# Altium schematic symbol library LATTICEPLDS_Library.SchLib: 291 symbols (part 32 of 32)
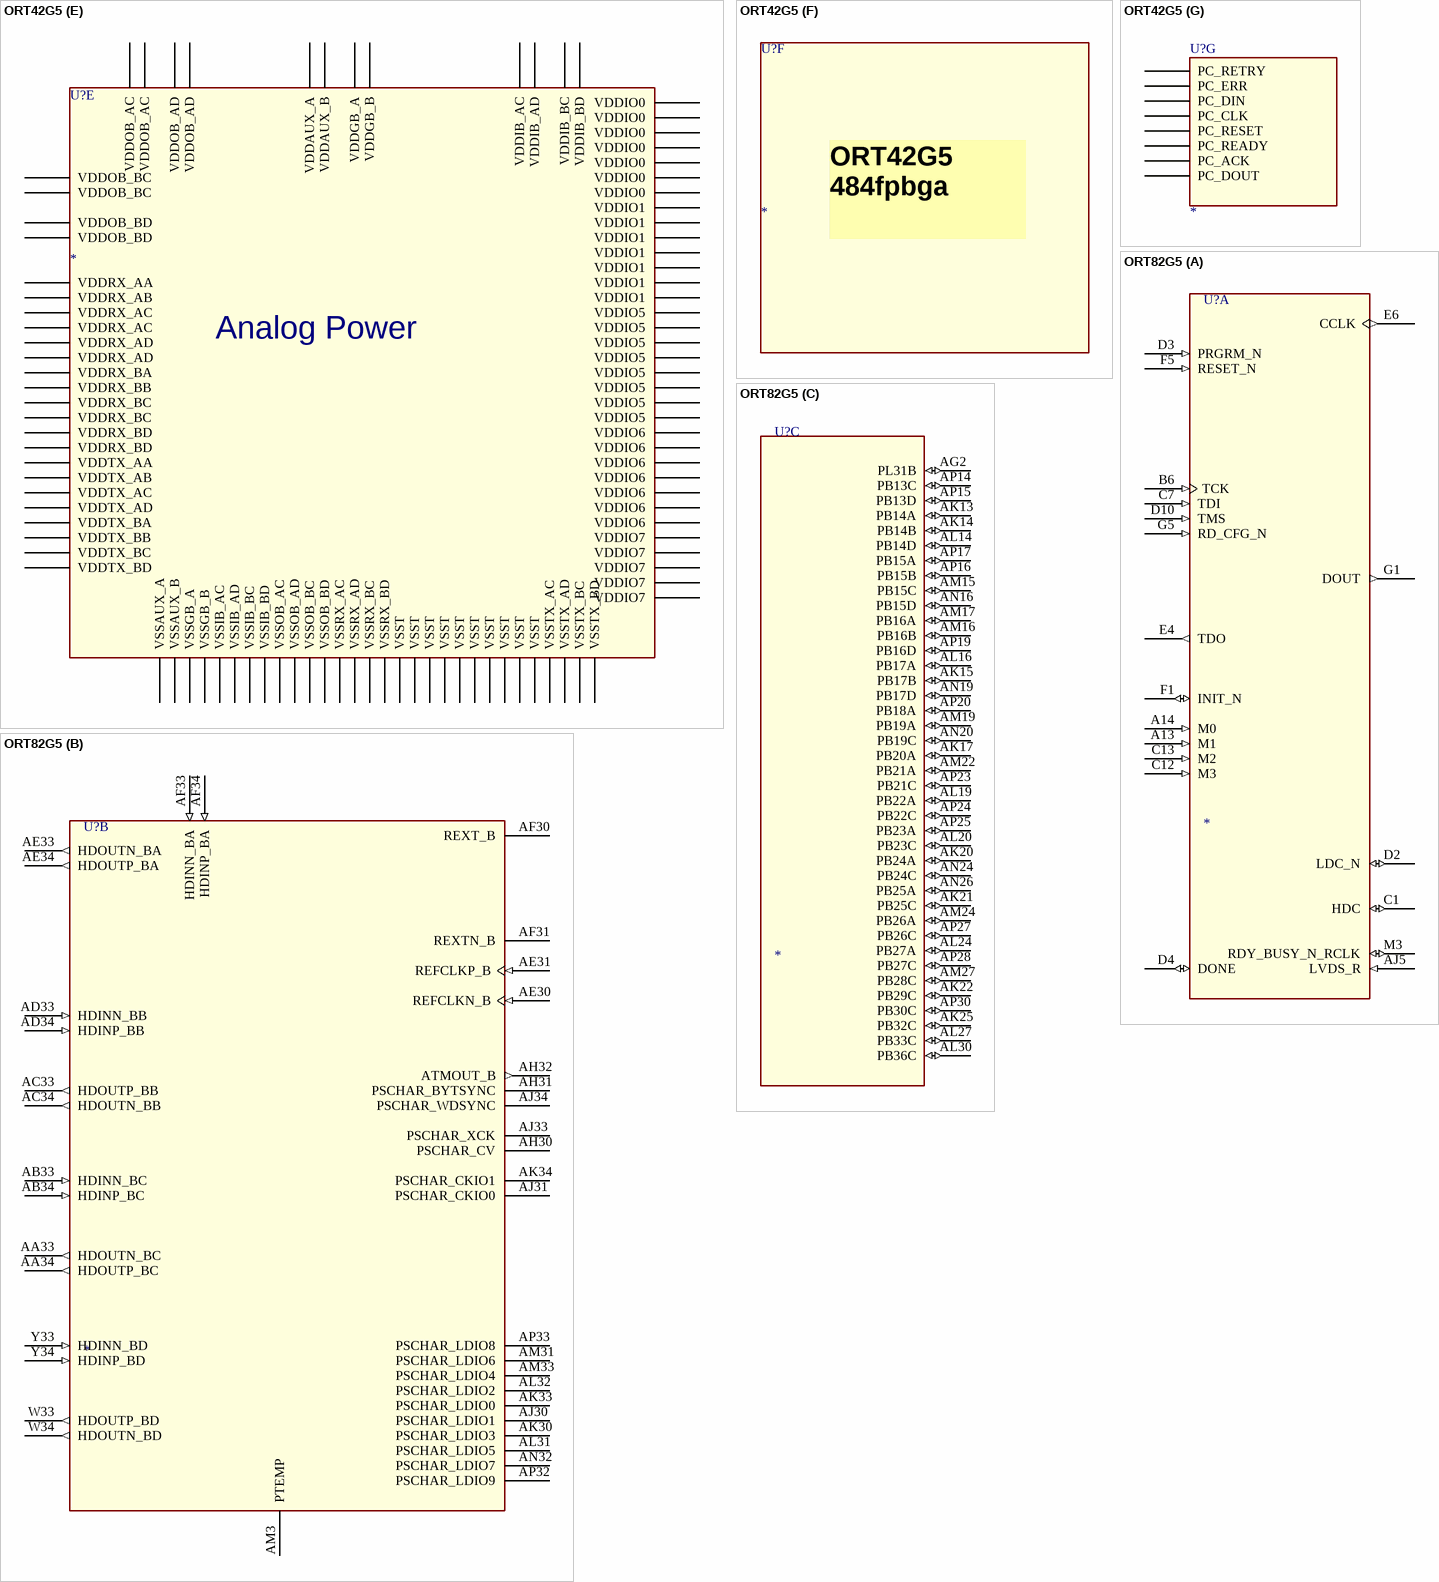
[diagram p334: symbols ORT42G5 to ORT82G5]

## ORT42G5
designator U?
footprint 484pbga
part A pins: A3 CFG_IRQ_N/MPI_IRQ_N, A4 TDI, A5 A18/MPI_TSZ0, A6 D0, A8 A21/MPI_BURST_N, A9 MPI_ACK_N, A12 PTCK0C, A13 DEBUG_BUS2, A15 DEBUG_BUS6, A16 DEBUG_BUS7, A17 DEBUG_BUS10, A18 DEBUG_BUS12, A19 DEBUG_BUS14, AA2 PLL_CK6T, AA4 D15, AB2 PLL_CK6C, AB3 DP3, B3 CCLK, B4 TCK, B5 D3, B6 TMS, B8 MPI_CLK, B9 MPI_RTRY_N, B10 DEBUG_BUS0, B11 DEBUG_BUS1, B12 PTCK0T, B15 DEBUG_BUS5, B18 DEBUG_BUS11, B19 DEBUG_BUS15, C1 PLL_CK0T, C2 PLL_CK0C, C3 DONE, C4 PLL_CK1C, C5 D1, C6 A20/MPI_BDIP_N, C7 M2, C8 M1, C10 PTCK1T, C11 DEBUG_BUS3, C12 DEBUG_BUS8, C13 DEBUG_BUS13, D1 D6, D2 D5, D3 RESET_N, D4 PLL_CK1T, D5 D2, D6 A19/MPI_TSZ1, D7 M3, D8 M0, D10 PTCK1C, D11 DEBUG_BUS4, D12 DEBUG_BUS9, E1 LDC_N, E2 HDC, E4 RD_DATA/TDO, E6 MPI_TEA_N, F1 A17, F4 PRGRM_N, F5 RD_CFG_N, G1 CS1, G2 CS0_N, G4 D7, H1 INIT_N, H2 DOUT, H3 A16, J1 A15, J2 A14, J3 RDY/BUSY_N/RCLK, J4 D4, K1 A13, K2 A12, K4 A11, K5 RD_N/MPI_STRB_N, L1 PLCK0C, L2 PLCK0T/SCKA, L3 A10, L4 A9, L5 A8, M1 A5, M2 A6, M3 PLCK1C, M4 PLCK1T/SCKB, N1 A2, N2 A3, N3 WR_N, N4 A7, N5 A4, P1 A0, P2 A1, P3 DP0, P4 DP1, R1 D10, R2 D9, R4 D8, U1 D11, U2 D12, U3 PTEMP, V2 D13, V4 LVDS_R, W3 DP2, W4 D14, W10 PBCK0T, W12 PBCK1C, Y1 PLL_CK7C, Y2 PLL_CK7T, Y10 PBCK0C, Y12 PBCK1T
part B pins: A7 PT9C, A10 PT14C/VREF_1_06, A11 PT16D/VREF_1_05, A14 PT20D, A20 PT29C, A21 PT31C/VREF_1_09, AA3 PB4A/VREF_6_05, AA5 PB8C/VREF_6_07, AA6 PB11C, AA7 PB14C/VREF_6_10, AA8 PB16C/VREF_6_11, AA9 PB18C/VREF_5_01, AA10 PB19B, AA11 PB20D, AA12 PB22D, AA13 PB24D, AA14 PB25D/VREF_5_04, AA15 PB27D, AA16 PB28D/VREF_5_06, AA17 PB30D, AA18 PB33D/VREF_5_08, AB4 PB6D, AB5 PB8D, AB6 PB11D, AB7 PB14D, AB8 PB16D, AB9 PB18D, AB10 PB19A, AB11 PB20C/VREF_5_02, AB12 PB22C, AB13 PB24C, AB14 PB25C, AB15 PB27C, AB16 PB28C, AB17 PB30C, AB18 PB33C, B7 PT9D/VREF_0_03, B13 PT19C/VREF_1_04, B14 PT20C, B16 PT24C/VREF_1_03, B17 PT26C/VREF_1_02, B20 PT29D, B21 PT31D, C9 PT15C, C14 PT30C, C15 PT33C/VREF_1_08, C16 PT36B, C18 PT32D, C19 PT32C, D9 PT15D, D13 PT27D/VREF_1_01, D14 PT30D, D15 PT33D, D16 PT36D, E11 PT22D, E14 PT34D/VREF_1_07, E15 PT34B, F14 PT35D, F15 PT35B, U8 PB16A, U9 PB18A, U10 PB21A, U11 PB22A, U12 PB23A, V6 PB9C, V7 PB14A, V8 PB15A, V9 PB17A, V10 PB20A, V11 PB24A, V12 PB25A, V14 PB34D, V16 PB35B, W5 PB7C, W6 PB10C/VREF_6_08, W7 PB12C/VREF_6_09, W8 PB15C, W9 PB17C, W11 PB21D/VREF_5_03, W13 PB26D/VREF_5_05, W14 PB29D, W15 PB31D, W16 PB36D, Y4 PB5C/VREF_6_06, Y5 PB7D, Y6 PB10D, Y7 PB12D, Y8 PB15D, Y9 PB17D, Y11 PB21C, Y13 PB26C, Y14 PB29C, Y15 PB31C/VREF_5_07, Y16 PB36C
part C pins: C21 PASB_RESETN, C22 PASB_TRISTN, D18 PLOOP_TEST_ENN, D19 PBIST_TEST_ENN, D21 PSYS_RSSIG_ALL, D22 PSYS_DOBISTN, E16 PASB_TESTCLK, E17 PASB_PDN, F21 REXTN_A, F22 REXT_A, G21 REFCLKP_A, G22 REFCLKN_A, H21 HDINP_AC, H22 HDINN_AC, J21 HDOUTP_AC, J22 HDOUTN_AC, K21 HDINN_AD, K22 HDINP_AD, L21 HDOUTN_AD, L22 HDOUTP_AD, M21 HDOUTP_BD, M22 HDOUTN_BD, N21 HDINP_BD, N22 HDINN_BD, R21 HDOUTN_BC, R22 HDOUTP_BC, T21 HDINN_BC, T22 HDINP_BC, U21 REFCLKN_B, U22 REFCLKP_B, V21 REXT_B, V22 REXTN_B
part D pins: A1 VSS (power), A2 VSS (power), A22 VSS (power), AA1 VSS (power), AA19 VSS (power), AA20 VSS (power), AA21 VSS (power), AA22 VSS (power), AB1 VSS (power), AB19 VSS (power), AB20 VSS (power), AB21 VSS (power), AB22 VSS (power), B1 VSS (power), B2 VSS (power), B22 VSS (power), C17 VDD33 (power), C20 VDD15 (power), D17 VDD33 (power), D20 VDD33 (power), E3 VDD33 (power), E5 VDD15 (power), F6 VDD15 (power), F7 VDD15 (power), F8 VDD15 (power), F9 VDD15 (power), F10 VDD15 (power), F11 VDD15 (power), F12 VDD15 (power), F13 VDD15 (power), F17 VDD15 (power), G6 VDD15 (power), G7 VSS (power), G8 VSS (power), G9 VSS (power), G10 VSS (power), G11 VSS (power), G12 VSS (power), G13 VSS (power), G16 VDD15 (power), H6 VDD15 (power), H7 VSS (power), H8 VSS (power), H9 VSS (power), H10 VSS (power), H11 VSS (power), H12 VSS (power), H13 VSS (power), H14 VDD15 (power), H15 VDD15 (power), J6 VDD15 (power), J7 VSS (power), J8 VSS (power), J9 VSS (power), J10 VSS (power), J11 VSS (power), J12 VSS (power), J13 VSS (power), J14 VSS (power), J15 VDD15 (power), K7 VDD15 (power), K8 VSS (power), K9 VSS (power), K10 VSS (power), K11 VSS (power), K12 VSS (power), K13 VSS (power), K14 VSS (power), K15 VDD15 (power), L7 VDD15 (power), L8 VSS (power), L9 VSS (power), L10 VSS (power), L11 VSS (power), L12 VSS (power), L13 VSS (power), L14 VSS (power), L15 VDD15 (power), M7 VDD15 (power), M8 VSS (power), M9 VSS (power), M10 VSS (power), M11 VSS (power), M12 VSS (power), M13 VSS (power), M14 VSS (power), M15 VDD15 (power), N7 VDD15 (power), N8 VSS (power), N9 VSS (power), N10 VSS (power), N11 VSS (power), N12 VSS (power), N13 VSS (power), N14 VSS (power), N15 VDD15 (power), P6 VDD15 (power), P7 VSS (power), P8 VSS (power), P9 VSS (power), P10 VSS (power), P11 VSS (power), P12 VSS (power), P13 VSS (power), P14 VSS (power), P15 VDD15 (power), R6 VDD15 (power), R7 VSS (power), R8 VSS (power), R9 VSS (power), R10 VSS (power), R11 VSS (power), R12 VSS (power), R13 VSS (power), R14 VSS (power), R15 VDD15 (power), T4 VDD15 (power), T6 VDD15 (power), T7 VDD15 (power), T10 VDD15 (power), T11 VDD15 (power), T12 VDD15 (power), T13 VDD15 (power), T14 VDD15 (power), T15 VDD15 (power), T16 VDD15 (power), U4 VDD15 (power), U5 VDD15 (power), U17 VDD15 (power), V3 VDD33 (power), V5 VDD15 (power), V15 VDD33 (power), V18 VDD15 (power), W19 VDD15 (power), Y3 VDD15 (power), Y17 VDD33 (power), Y18 VDD33 (power), Y19 VDD15 (power), Y20 VDD15 (power)
part E pins: E7 VDDIO0 (power), E8 VDDIO0 (power), E9 VDDIO0 (power), E10 VDDIO0 (power), E12 VDDIO1 (power), E13 VDDIO1 (power), E18 VDDIO1 (power), E19 VDDIO1 (power), E20 VSSAUX_B (power), E21 VDDGB_A (power), E22 VSSGB_A (power), F16 VDDIO1 (power), F18 VDDAUX_B (power), F19 VSSIB_BC (power), F20 VSSRX_BC (power), G5 VDDIO0 (power), G14 VDDIO1 (power), G15 VDDIO1 (power), G17 VDDRX_BA (power), G18 VDDTX_BA (power), G19 VSSOB_BC (power), G20 VDDIB_AC (power), H5 VDDIO0 (power), H16 VSSTX_BC (power), H17 VSSIB_BD (power), H18 VSSRX_BD (power), H19 VSSOB_BD (power), H20 VDDOB_AC (power), J5 VDDIO0 (power), J16 VDDRX_BB (power), J17 VDDTX_BB (power), J18 VDDRX_BC (power), J19 VDDRX_BC (power), J20 VDDOB_AC (power), K6 VDDIO7 (power), K16 VDDTX_BC (power), K17 VDDRX_BD (power), K18 VDDRX_BD (power), K19 VDDTX_BD (power), K20 VDDIB_AD (power), L6 VDDIO7 (power), L16 VSSTX_BD (power), L17 VSSTX_AD (power), L18 VSSOB_AD (power), L19 VSSRX_AD (power), L20 VDDOB_AD (power), M5 VDDIO7 (power), M6 VDDIO7 (power), M16 VSSIB_AD (power), M17 VSSTX_AC (power), M18 VSSOB_AC (power), M19 VSSRX_AC (power), M20 VDDOB_AD (power), N6 VDDIO7 (power), N16 VDDTX_AD (power), N17 VDDRX_AD (power), N18 VDDRX_AD (power), N19 VDDTX_AC (power), N20 VDDOB_BD (power), P5 VDDIO6 (power), P16 VDDRX_AC (power), P17 VDDRX_AC (power), P18 VDDTX_AB (power), P19 VDDRX_AB (power), P20 VDDOB_BD (power), P21 VDDOB_BC (power), P22 VDDIB_BD (power), R5 VDDIO6 (power), R16 VSSIB_AC (power), R17 VSSAUX_A (power), R18 VSST (power), R19 VSST (power), R20 VDDOB_BC (power), T5 VDDIO6 (power), T8 VDDIO6 (power), T9 VDDIO6 (power), T17 VDDTX_AA (power), T18 VDDRX_AA (power), T19 VSST (power), T20 VDDIB_BC (power), U6 VDDIO6 (power), U7 VDDIO6 (power), U13 VDDIO5 (power), U14 VDDIO5 (power), U15 VDDIO5 (power), U16 VDDIO5 (power), U18 VDDAUX_A (power), U19 VSST (power), U20 VSST (power), V13 VDDIO5 (power), V17 VDDIO5 (power), V19 VSST (power), V20 VSST (power), W17 VDDIO5 (power), W18 VDDIO5 (power), W20 VSST (power), W21 VSSGB_B (power), W22 VDDGB_B (power), Y21 VSST (power), Y22 VSST (power)
part G pins: F3 PC_DIN, G3 PC_CLK, H4 PC_READY, K3 PC_ACK, R3 PC_DOUT, T1 PC_ERR, T2 PC_RETRY, T3 PC_RESET
part A text: CFG/MPI
part B text: General / FPGA / Pins
part C text: SERDES
part D text: Digital Power
part E text: Analog Power
part F text: ORT42G5 / 484fpbga

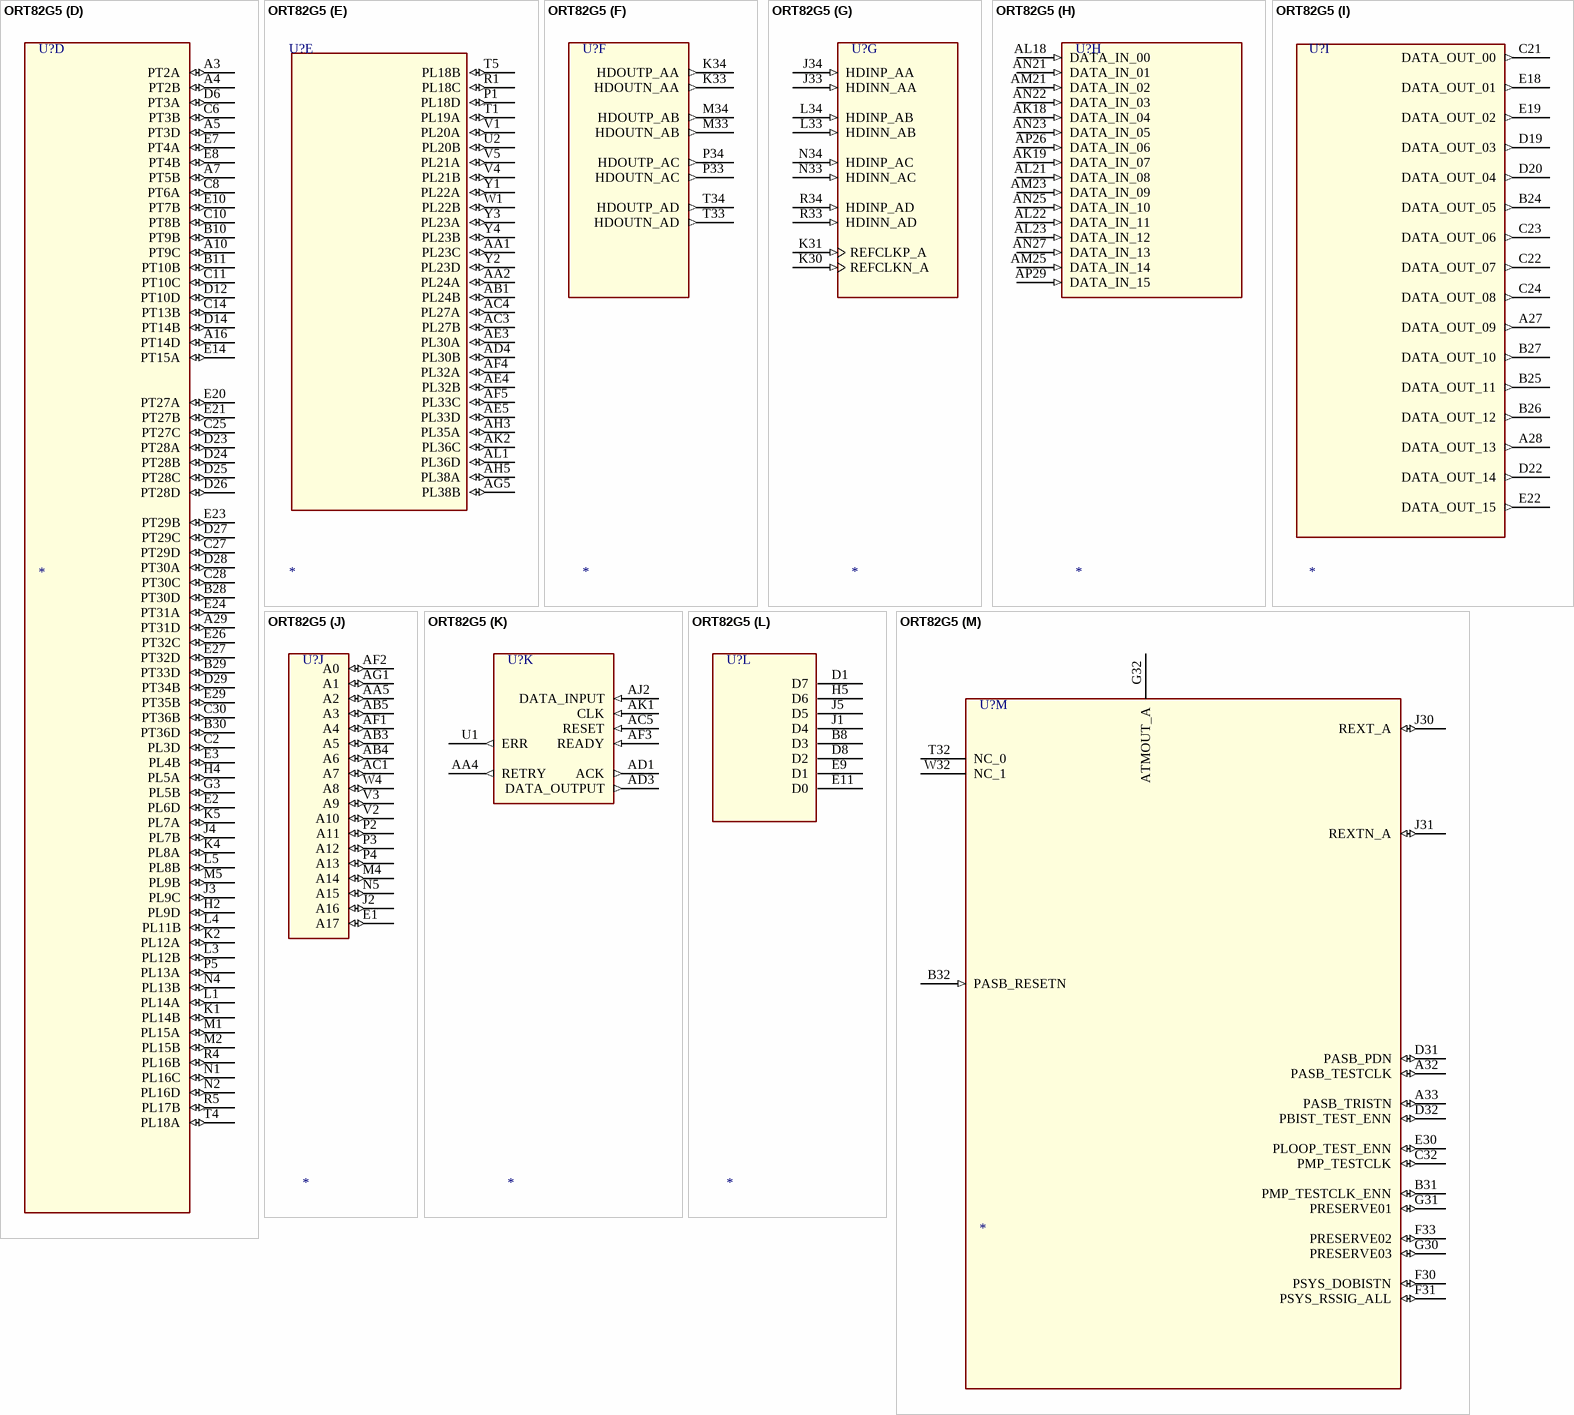
[diagram p297: symbol ORT82G5]

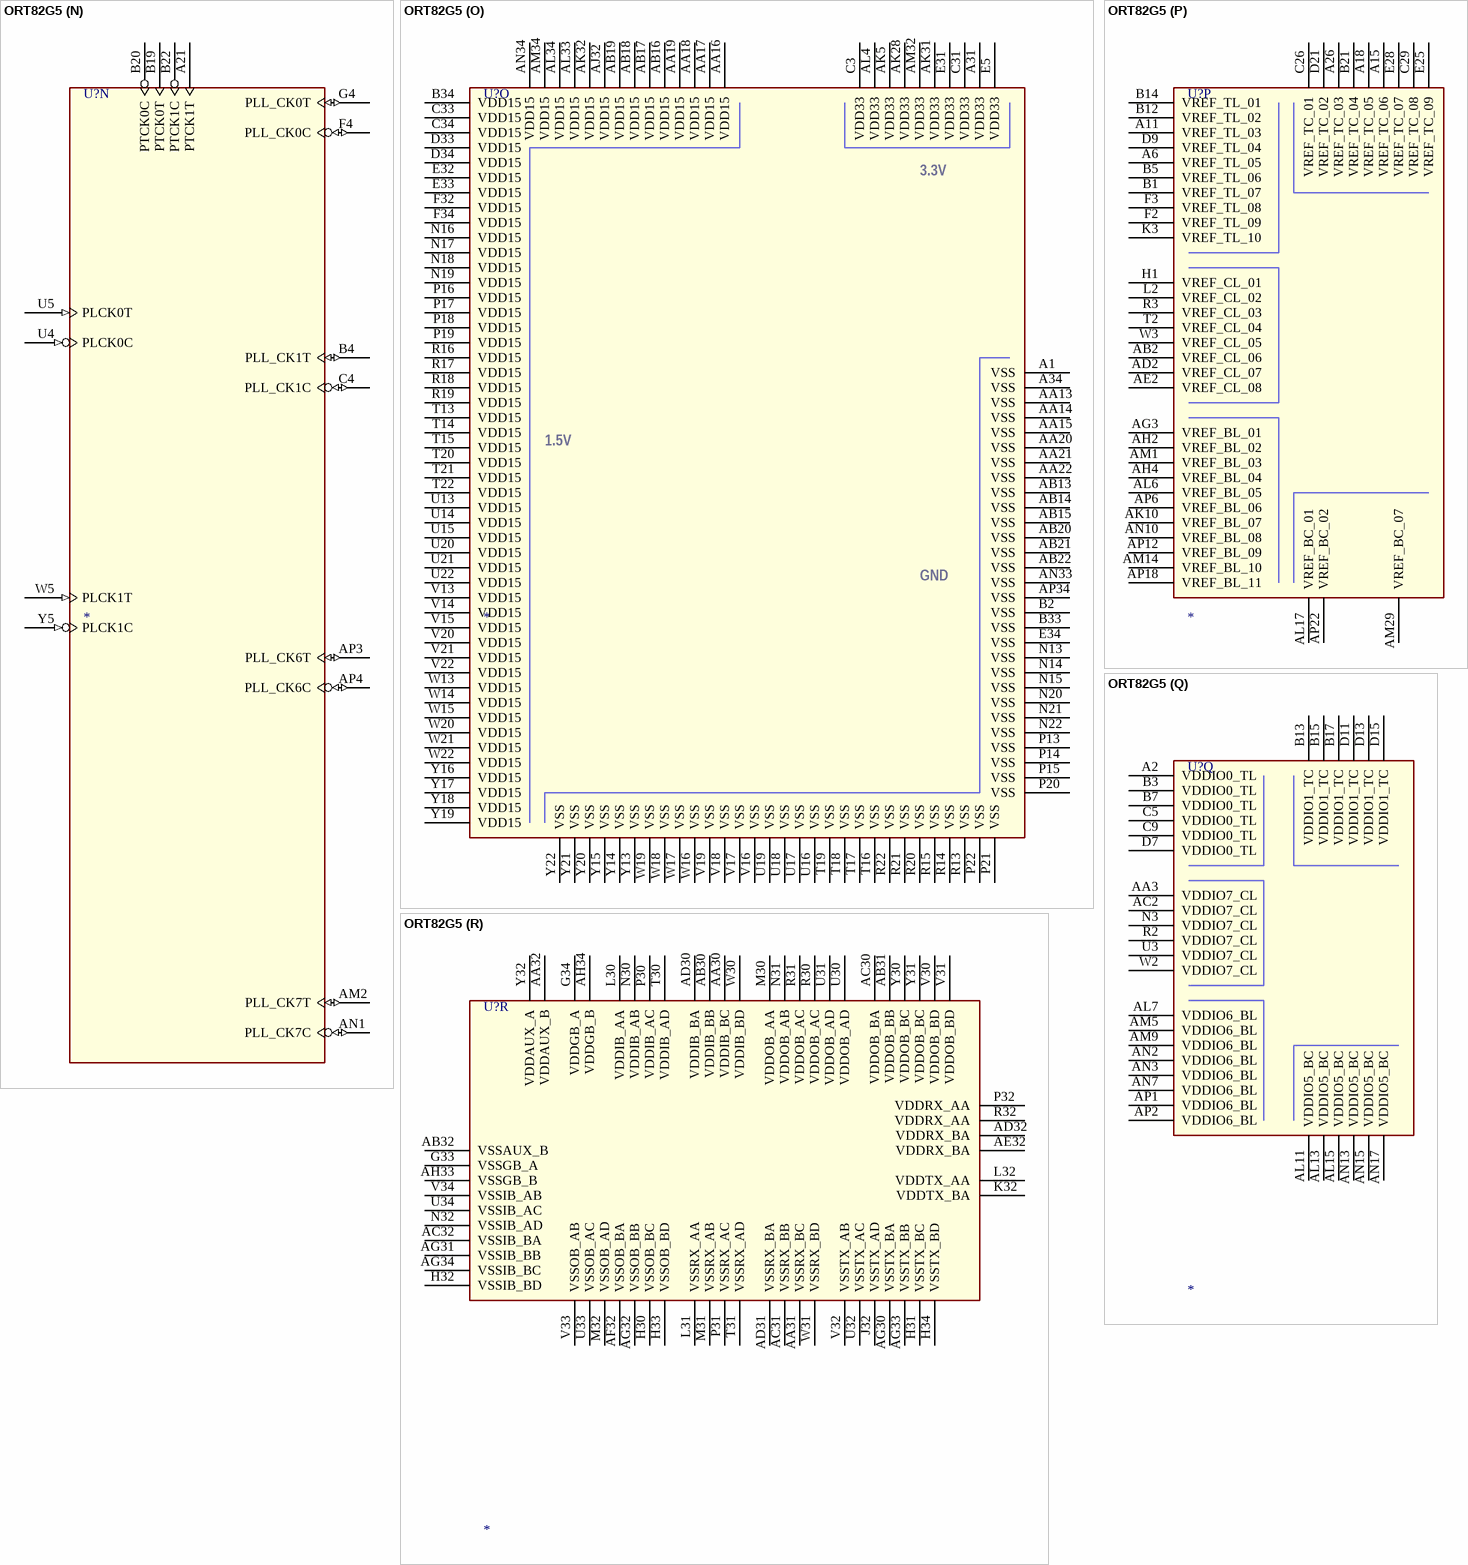
[diagram p298: symbol ORT82G5]

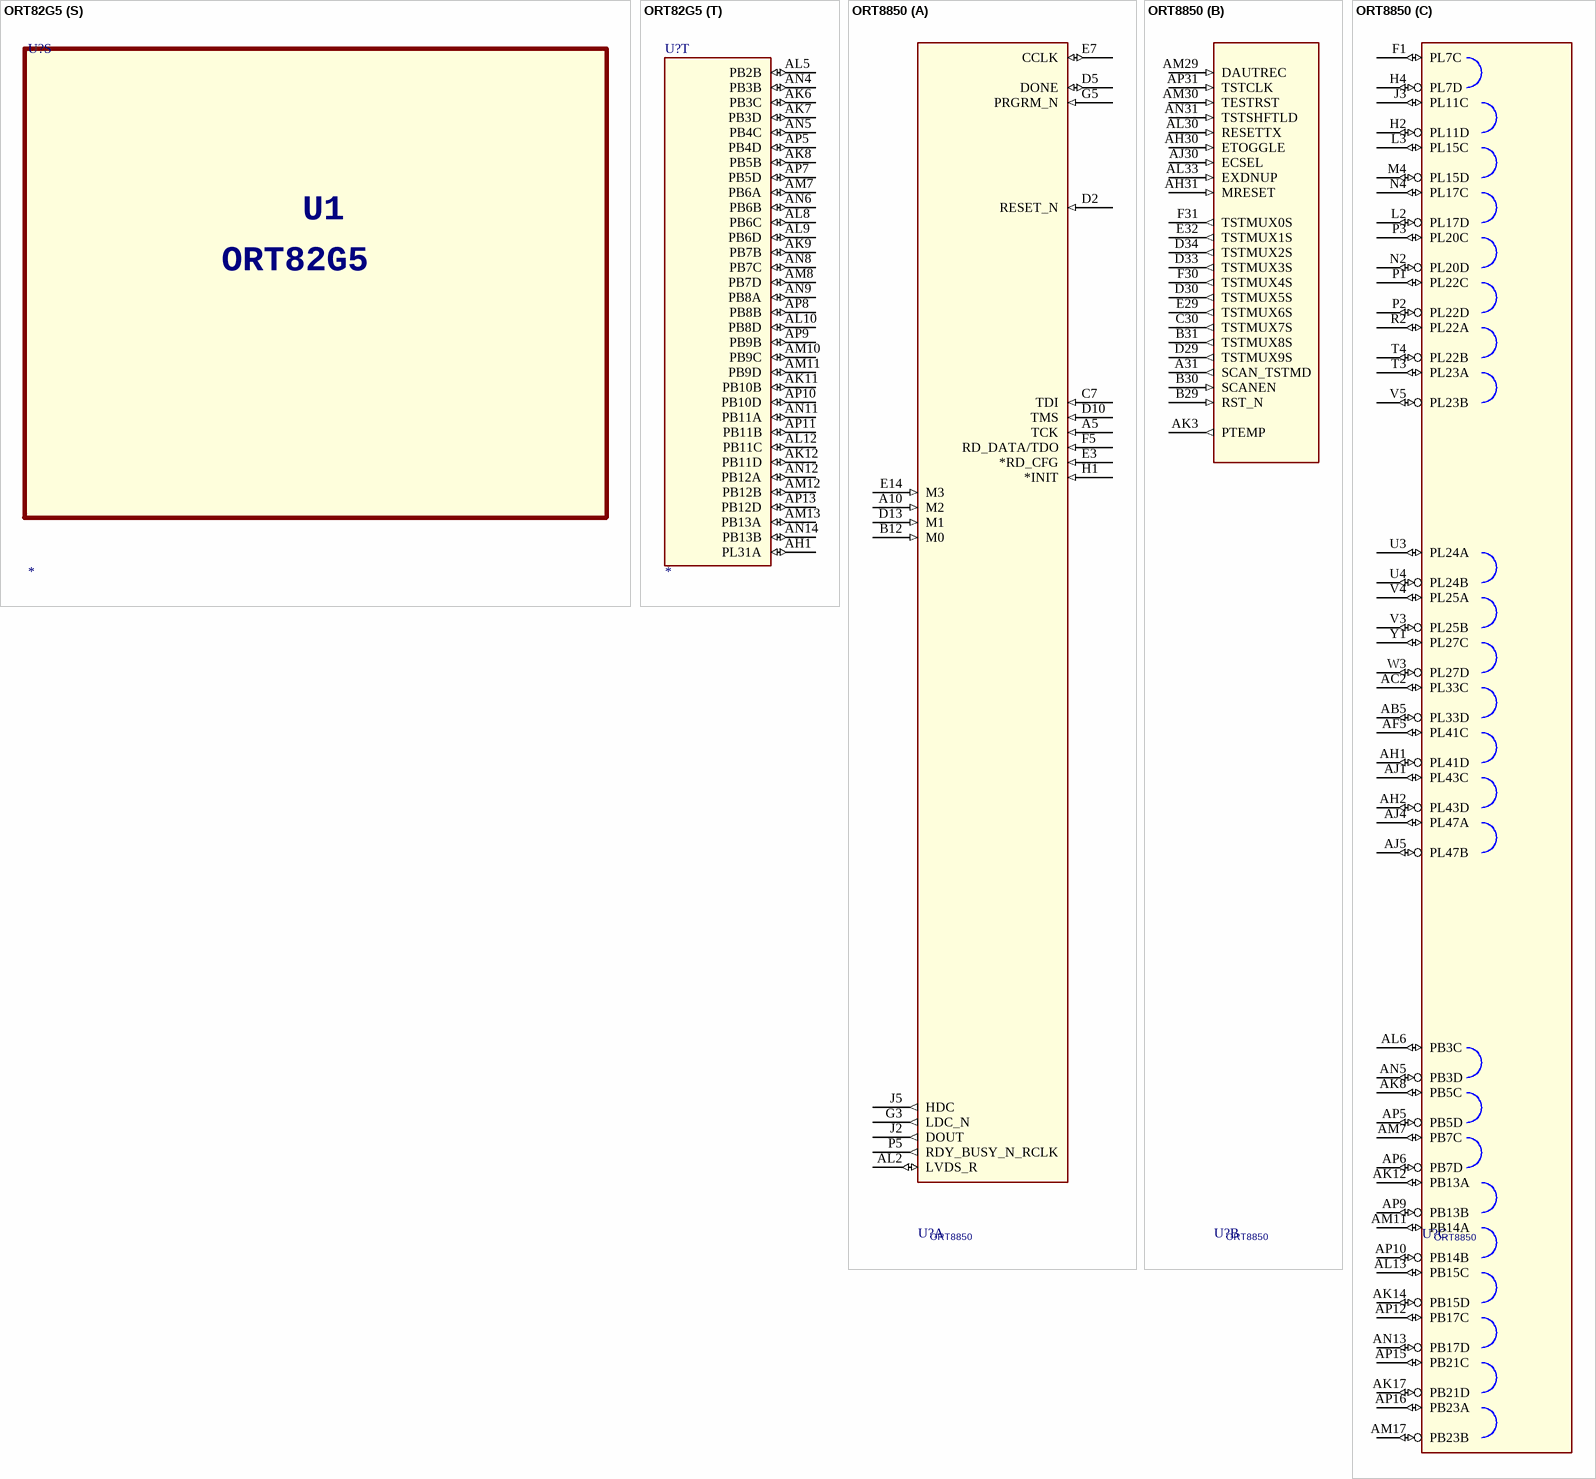
[diagram p299: symbols ORT82G5 to ORT8850]

## ORT82G5
designator U?
footprint 680pinbga
part A pins: A13 M1 (in), A14 M0 (in), AJ5 LVDS_R (in), B6 TCK (in), C1 HDC (io), C7 TDI (in), C12 M3 (in), C13 M2 (in), D2 LDC_N (io), D3 PRGRM_N (in), D4 DONE (io), D10 TMS (in), E4 TDO (out), E6 CCLK (out), F1 INIT_N (io), F5 RESET_N (in), G1 DOUT (out), G5 RD_CFG_N (in), M3 RDY_BUSY_N_RCLK (io)
part B pins: AA33 HDOUTN_BC (out), AA34 HDOUTP_BC (out), AB33 HDINN_BC (in), AB34 HDINP_BC (in), AC33 HDOUTP_BB (out), AC34 HDOUTN_BB (out), AD33 HDINN_BB (in), AD34 HDINP_BB (in), AE30 REFCLKN_B (in), AE31 REFCLKP_B (in), AE33 HDOUTN_BA (out), AE34 HDOUTP_BA (out), AF30 REXT_B, AF31 REXTN_B, AF33 HDINN_BA (in), AF34 HDINP_BA (in), AH30 PSCHAR_CV, AH31 PSCHAR_BYTSYNC, AH32 ATMOUT_B (out), AJ30 PSCHAR_LDIO1, AJ31 PSCHAR_CKIO0, AJ33 PSCHAR_XCK, AJ34 PSCHAR_WDSYNC, AK30 PSCHAR_LDIO3, AK33 PSCHAR_LDIO0, AK34 PSCHAR_CKIO1, AL31 PSCHAR_LDIO5, AL32 PSCHAR_LDIO2, AM3 PTEMP, AM31 PSCHAR_LDIO6, AM33 PSCHAR_LDIO4, AN32 PSCHAR_LDIO7, AP32 PSCHAR_LDIO9, AP33 PSCHAR_LDIO8, W33 HDOUTP_BD (out), W34 HDOUTN_BD (out), Y33 HDINN_BD (in), Y34 HDINP_BD (in)
part C pins: AG2 PL31B (io), AK13 PB14A (io), AK14 PB14B (io), AK15 PB17B (io), AK17 PB20A (io), AK20 PB24A (io), AK21 PB25C (io), AK22 PB29C (io), AK25 PB32C (io), AL14 PB14D (io), AL16 PB17A (io), AL19 PB22A (io), AL20 PB23C (io), AL24 PB27A (io), AL27 PB33C (io), AL30 PB36C (io), AM15 PB15C (io), AM16 PB16B (io), AM17 PB16A (io), AM19 PB19A (io), AM22 PB21A (io), AM24 PB26A (io), AM27 PB28C (io), AN16 PB15D (io), AN19 PB17D (io), AN20 PB19C (io), AN24 PB24C (io), AN26 PB25A (io), AP14 PB13C (io), AP15 PB13D (io), AP16 PB15B (io), AP17 PB15A (io), AP19 PB16D (io), AP20 PB18A (io), AP23 PB21C (io), AP24 PB22C (io), AP25 PB23A (io), AP27 PB26C (io), AP28 PB27C (io), AP30 PB30C (io)
part D pins: A3 PT2A (io), A4 PT2B (io), A5 PT3D (io), A7 PT5B (io), A10 PT9C (io), A16 PT14D (io), A29 PT31D (io), B10 PT9B (io), B11 PT10B (io), B28 PT30D (io), B29 PT33D (io), B30 PT36D (io), C2 PL3D (io), C6 PT3B (io), C8 PT6A (io), C10 PT8B (io), C11 PT10C (io), C14 PT13B (io), C25 PT27C (io), C27 PT29D (io), C28 PT30C (io), C30 PT36B (io), D6 PT3A (io), D12 PT10D (io), D14 PT14B (io), D23 PT28A (io), D24 PT28B (io), D25 PT28C (io), D26 PT28D (io), D27 PT29C (io), D28 PT30A (io), D29 PT34B (io), E2 PL6D (io), E3 PL4B (io), E7 PT4A (io), E8 PT4B (io), E10 PT7B (io), E14 PT15A (io), E20 PT27A (io), E21 PT27B (io), E23 PT29B (io), E24 PT31A (io), E26 PT32C (io), E27 PT32D (io), E29 PT35B (io), G3 PL5B (io), H2 PL9D (io), H4 PL5A (io), J3 PL9C (io), J4 PL7B (io), K1 PL14B (io), K2 PL12A (io), K4 PL8A (io), K5 PL7A (io), L1 PL14A (io), L3 PL12B (io), L4 PL11B (io), L5 PL8B (io), M1 PL15A (io), M2 PL15B (io), M5 PL9B (io), N1 PL16C (io), N2 PL16D (io), N4 PL13B (io), P5 PL13A (io), R4 PL16B (io), R5 PL17B (io), T4 PL18A (io)
part E pins: AA1 PL23C (io), AA2 PL24A (io), AB1 PL24B (io), AC3 PL27B (io), AC4 PL27A (io), AD4 PL30B (io), AE3 PL30A (io), AE4 PL32B (io), AE5 PL33D (io), AF4 PL32A (io), AF5 PL33C (io), AG5 PL38B (io), AH3 PL35A (io), AH5 PL38A (io), AK2 PL36C (io), AL1 PL36D (io), P1 PL18D (io), R1 PL18C (io), T1 PL19A (io), T5 PL18B (io), U2 PL20B (io), V1 PL20A (io), V4 PL21B (io), V5 PL21A (io), W1 PL22B (io), Y1 PL22A (io), Y2 PL23D (io), Y3 PL23A (io), Y4 PL23B (io)
part F pins: K33 HDOUTN_AA (out), K34 HDOUTP_AA (out), M33 HDOUTN_AB (out), M34 HDOUTP_AB (out), P33 HDOUTN_AC (out), P34 HDOUTP_AC (out), T33 HDOUTN_AD (out), T34 HDOUTP_AD (out)
part G pins: J33 HDINN_AA (in), J34 HDINP_AA (in), K30 REFCLKN_A (in), K31 REFCLKP_A (in), L33 HDINN_AB (in), L34 HDINP_AB (in), N33 HDINN_AC (in), N34 HDINP_AC (in), R33 HDINN_AD (in), R34 HDINP_AD (in)
part H pins: AK18 DATA_IN_04 (in), AK19 DATA_IN_07 (in), AL18 DATA_IN_00 (in), AL21 DATA_IN_08 (in), AL22 DATA_IN_11 (in), AL23 DATA_IN_12 (in), AM21 DATA_IN_02 (in), AM23 DATA_IN_09 (in), AM25 DATA_IN_14 (in), AN21 DATA_IN_01 (in), AN22 DATA_IN_03 (in), AN23 DATA_IN_05 (in), AN25 DATA_IN_10 (in), AN27 DATA_IN_13 (in), AP26 DATA_IN_06 (in), AP29 DATA_IN_15 (in)
part I pins: A27 DATA_OUT_09 (out), A28 DATA_OUT_13 (out), B24 DATA_OUT_05 (out), B25 DATA_OUT_11 (out), B26 DATA_OUT_12 (out), B27 DATA_OUT_10 (out), C21 DATA_OUT_00 (out), C22 DATA_OUT_07 (out), C23 DATA_OUT_06 (out), C24 DATA_OUT_08 (out), D19 DATA_OUT_03 (out), D20 DATA_OUT_04 (out), D22 DATA_OUT_14 (out), E18 DATA_OUT_01 (out), E19 DATA_OUT_02 (out), E22 DATA_OUT_15 (out)
part J pins: AA5 A2 (io), AB3 A5 (io), AB4 A6 (io), AB5 A3 (io), AC1 A7 (io), AF1 A4 (io), AF2 A0 (io), AG1 A1 (io), E1 A17 (io), J2 A16 (io), M4 A14 (io), N5 A15 (io), P2 A11 (io), P3 A12 (io), P4 A13 (io), V2 A10 (io), V3 A9 (io), W4 A8 (io)
part K pins: AA4 RETRY (out), AC5 RESET (in), AD1 ACK (out), AD3 DATA_OUTPUT (out), AF3 READY (in), AJ2 DATA_INPUT (in), AK1 CLK (in), U1 ERR (out)
part L pins: B8 D3, D1 D7, D8 D2, E9 D1, E11 D0, H5 D6, J1 D4, J5 D5
part M pins: A32 PASB_TESTCLK (io), A33 PASB_TRISTN (io), B31 PMP_TESTCLK_ENN (io), B32 PASB_RESETN (in), C32 PMP_TESTCLK (io), D31 PASB_PDN (io), D32 PBIST_TEST_ENN (io), E30 PLOOP_TEST_ENN (io), F30 PSYS_DOBISTN (io), F31 PSYS_RSSIG_ALL (io), F33 PRESERVE02 (io), G30 PRESERVE03 (io), G31 PRESERVE01 (io), G32 ATMOUT_A, J30 REXT_A (io), J31 REXTN_A (io), T32 NC_0, W32 NC_1
part N pins: A21 PTCK1T, AM2 PLL_CK7T (io), AN1 PLL_CK7C (io), AP3 PLL_CK6T (io), AP4 PLL_CK6C (io), B4 PLL_CK1T (io), B19 PTCK0T, B20 PTCK0C, B22 PTCK1C, C4 PLL_CK1C (io), F4 PLL_CK0C (io), G4 PLL_CK0T (io), U4 PLCK0C (in), U5 PLCK0T (in), W5 PLCK1T (in), Y5 PLCK1C (in)
part O pins: A1 VSS (power), A31 VDD33 (power), A34 VSS (power), AA13 VSS (power), AA14 VSS (power), AA15 VSS (power), AA16 VDD15 (power), AA17 VDD15 (power), AA18 VDD15 (power), AA19 VDD15 (power), AA20 VSS (power), AA21 VSS (power), AA22 VSS (power), AB13 VSS (power), AB14 VSS (power), AB15 VSS (power), AB16 VDD15 (power), AB17 VDD15 (power), AB18 VDD15 (power), AB19 VDD15 (power), AB20 VSS (power), AB21 VSS (power), AB22 VSS (power), AJ32 VDD15 (power), AK5 VDD33 (power), AK28 VDD33 (power), AK31 VDD33 (power), AK32 VDD15 (power), AL4 VDD33 (power), AL33 VDD15 (power), AL34 VDD15 (power), AM32 VDD33 (power), AM34 VDD15 (power), AN33 VSS (power), AN34 VDD15 (power), AP34 VSS (power), B2 VSS (power), B33 VSS (power), B34 VDD15 (power), C3 VDD33 (power), C31 VDD33 (power), C33 VDD15 (power), C34 VDD15 (power), D33 VDD15 (power), D34 VDD15 (power), E5 VDD33 (power), E31 VDD33 (power), E32 VDD15 (power), E33 VDD15 (power), E34 VSS (power), F32 VDD15 (power), F34 VDD15 (power), N13 VSS (power), N14 VSS (power), N15 VSS (power), N16 VDD15 (power), N17 VDD15 (power), N18 VDD15 (power), N19 VDD15 (power), N20 VSS (power), N21 VSS (power), N22 VSS (power), P13 VSS (power), P14 VSS (power), P15 VSS (power), P16 VDD15 (power), P17 VDD15 (power), P18 VDD15 (power), P19 VDD15 (power), P20 VSS (power), P21 VSS (power), P22 VSS (power), R13 VSS (power), R14 VSS (power), R15 VSS (power), R16 VDD15 (power), R17 VDD15 (power), R18 VDD15 (power), R19 VDD15 (power), R20 VSS (power), R21 VSS (power), R22 VSS (power), T13 VDD15 (power), T14 VDD15 (power), T15 VDD15 (power), T16 VSS (power), T17 VSS (power), T18 VSS (power), T19 VSS (power), T20 VDD15 (power), T21 VDD15 (power), T22 VDD15 (power), U13 VDD15 (power), U14 VDD15 (power), U15 VDD15 (power), U16 VSS (power), U17 VSS (power), U18 VSS (power), U19 VSS (power), U20 VDD15 (power), U21 VDD15 (power), U22 VDD15 (power), V13 VDD15 (power), V14 VDD15 (power), V15 VDD15 (power), V16 VSS (power), V17 VSS (power), V18 VSS (power), V19 VSS (power), V20 VDD15 (power), V21 VDD15 (power), V22 VDD15 (power), W13 VDD15 (power), W14 VDD15 (power), W15 VDD15 (power), W16 VSS (power), W17 VSS (power), W18 VSS (power), W19 VSS (power), W20 VDD15 (power), W21 VDD15 (power), W22 VDD15 (power), Y13 VSS (power), Y14 VSS (power), Y15 VSS (power), Y16 VDD15 (power), Y17 VDD15 (power), Y18 VDD15 (power), Y19 VDD15 (power), Y20 VSS (power), Y21 VSS (power), Y22 VSS (power)
part P pins: A6 VREF_TL_05 (power), A11 VREF_TL_03 (power), A15 VREF_TC_06 (power), A18 VREF_TC_05 (power), A26 VREF_TC_03 (power), AB2 VREF_CL_06 (power), AD2 VREF_CL_07 (power), AE2 VREF_CL_08 (power), AG3 VREF_BL_01 (power), AH2 VREF_BL_02 (power), AH4 VREF_BL_04 (power), AK10 VREF_BL_07 (power), AL6 VREF_BL_05 (power), AL17 VREF_BC_01 (power), AM1 VREF_BL_03 (power), AM14 VREF_BL_10 (power), AM29 VREF_BC_07 (power), AN10 VREF_BL_08 (power), AP6 VREF_BL_06 (power), AP12 VREF_BL_09 (power), AP18 VREF_BL_11 (power), AP22 VREF_BC_02 (power), B1 VREF_TL_07 (power), B5 VREF_TL_06 (power), B12 VREF_TL_02 (power), B14 VREF_TL_01 (power), B21 VREF_TC_04 (power), C26 VREF_TC_01 (power), C29 VREF_TC_08 (power), D9 VREF_TL_04 (power), D21 VREF_TC_02 (power), E25 VREF_TC_09 (power), E28 VREF_TC_07 (power), F2 VREF_TL_09 (power), F3 VREF_TL_08 (power), H1 VREF_CL_01 (power), K3 VREF_TL_10 (power), L2 VREF_CL_02 (power), R3 VREF_CL_03 (power), T2 VREF_CL_04 (power), W3 VREF_CL_05 (power)
part Q pins: A2 VDDIO0_TL (power), AA3 VDDIO7_CL (power), AC2 VDDIO7_CL (power), AL7 VDDIO6_BL (power), AL11 VDDIO5_BC (power), AL13 VDDIO5_BC (power), AL15 VDDIO5_BC (power), AM5 VDDIO6_BL (power), AM9 VDDIO6_BL (power), AN2 VDDIO6_BL (power), AN3 VDDIO6_BL (power), AN7 VDDIO6_BL (power), AN13 VDDIO5_BC (power), AN15 VDDIO5_BC (power), AN17 VDDIO5_BC (power), AP1 VDDIO6_BL (power), AP2 VDDIO6_BL (power), B3 VDDIO0_TL (power), B7 VDDIO0_TL (power), B13 VDDIO1_TC (power), B15 VDDIO1_TC (power), B17 VDDIO1_TC (power), C5 VDDIO0_TL (power), C9 VDDIO0_TL (power), D7 VDDIO0_TL (power), D11 VDDIO1_TC (power), D13 VDDIO1_TC (power), D15 VDDIO1_TC (power), N3 VDDIO7_CL (power), R2 VDDIO7_CL (power), U3 VDDIO7_CL (power), W2 VDDIO7_CL (power)
part R pins: AA30 VDDIB_BC (power), AA31 VSSRX_BC (power), AA32 VDDAUX_B (power), AB30 VDDIB_BB (power), AB31 VDDOB_BB (power), AB32 VSSAUX_B (power), AC30 VDDOB_BA (power), AC31 VSSRX_BB (power), AC32 VSSIB_BA (power), AD30 VDDIB_BA (power), AD31 VSSRX_BA (power), AD32 VDDRX_BA (power), AE32 VDDRX_BA (power), AF32 VSSOB_BA (power), AG30 VSSTX_BA (power), AG31 VSSIB_BB (power), AG32 VSSOB_BB (power), AG33 VSSTX_BB (power), AG34 VSSIB_BC (power), AH33 VSSGB_B (power), AH34 VDDGB_B (power), G33 VSSGB_A (power), G34 VDDGB_A (power), H30 VSSOB_BC (power), H31 VSSTX_BC (power), H32 VSSIB_BD (power), H33 VSSOB_BD (power), H34 VSSTX_BD (power), J32 VSSTX_AD (power), K32 VDDTX_BA (power), L30 VDDIB_AA (power), L31 VSSRX_AA (power), L32 VDDTX_AA (power), M30 VDDOB_AA (power), M31 VSSRX_AB (power), M32 VSSOB_AD (power), N30 VDDIB_AB (power), N31 VDDOB_AB (power), N32 VSSIB_AD (power), P30 VDDIB_AC (power), P31 VSSRX_AC (power), P32 VDDRX_AA (power), R30 VDDOB_AC (power), R31 VDDOB_AC (power), R32 VDDRX_AA (power), T30 VDDIB_AD (power), T31 VSSRX_AD (power), U30 VDDOB_AD (power), U31 VDDOB_AD (power), U32 VSSTX_AC (power), U33 VSSOB_AC (power), U34 VSSIB_AC (power), V30 VDDOB_BD (power), V31 VDDOB_BD (power), V32 VSSTX_AB (power), V33 VSSOB_AB (power), V34 VSSIB_AB (power), W30 VDDIB_BD (power), W31 VSSRX_BD (power), Y30 VDDOB_BC (power), Y31 VDDOB_BC (power), Y32 VDDAUX_A (power)